# Altium footprint library DIOT_temperature_logger.PcbLib: 100 footprints (part 5 of 7)
Each footprint in its own frame and in the unit in brackets; x right, y up, seen from the top. Pads: shape width x height; smd on the part's side, far side on the other; paste and mask are expansions set on the pad; w line width, h text height; cw(c..) or ccw(c..) is an arc to the next point about the centre after c.
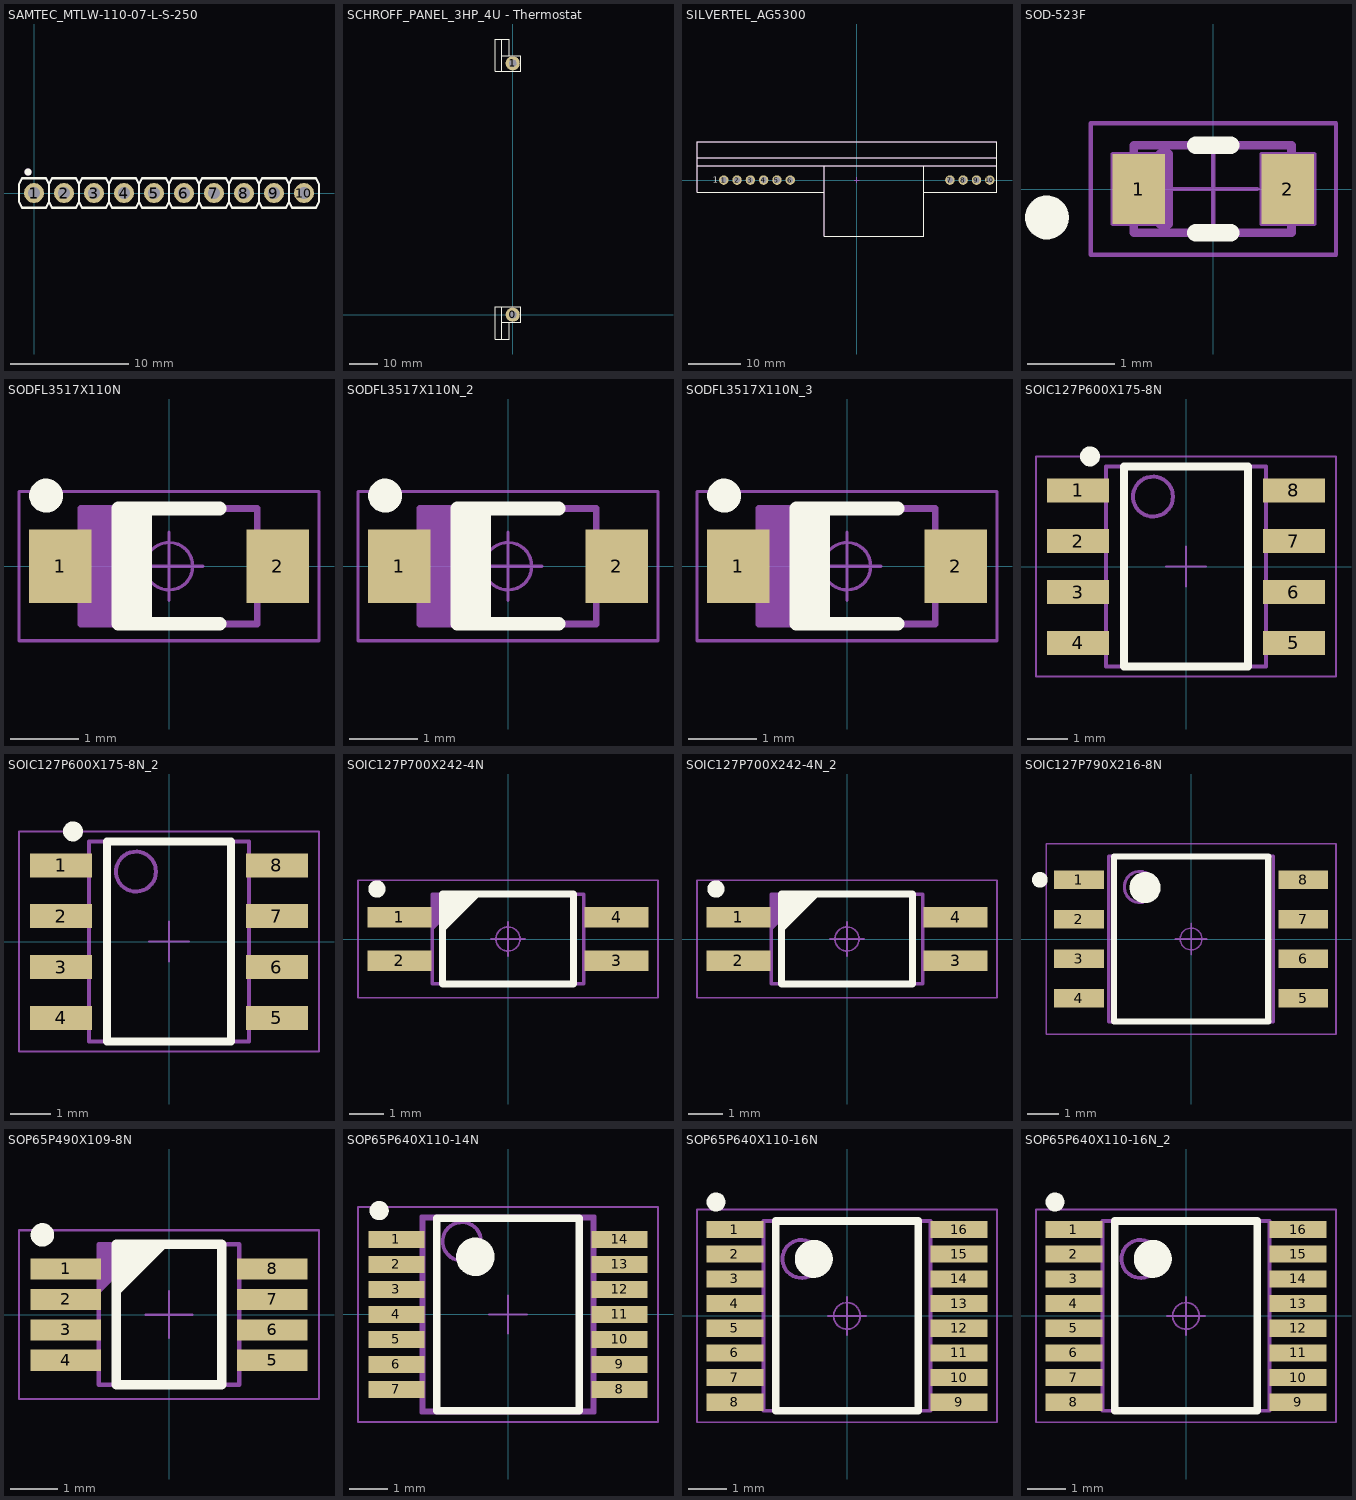
[diagram p4: the footprints below, top view; thin cyan lines are the x and y axes]

## SAMTEC_MTLW-110-07-L-S-250 [mm] "10 Contacts - Pitch 2.54mm - Single Row Through Mount Straight Header (Post Lead = 6.35mm, Tail Lead 3.05mm, Insulator 1.52mm)"
height 7.87
pads (10):
  round 1.7 hole 1: 1(0,0) 2(2.54,0) 3(5.08,0) 4(7.62,0) 5(10.16,0) 6(12.7,0) 7(15.24,0) 8(17.78,0) 9(20.32,0) 10(22.86,0)
Top Overlay:
  circle w0.3: c-0.508,1.778 r0.15
  lines w0.2: 1.27,-0.737 1.27,0.737 ; 1.27,-0.737 1.524,-1.245 3.556,-1.245 3.81,-0.737 ; 1.27,-0.737 1.016,-1.245 -1.016,-1.245 -1.27,-0.737 -1.27,0.737 -1.016,1.245 1.016,1.245 1.27,0.737 ; 1.27,0.737 1.524,1.245 3.556,1.245 3.81,0.737 ; 3.81,-0.737 3.81,0.737 ; 3.81,-0.737 4.064,-1.245 6.096,-1.245 6.35,-0.737 ; 3.81,0.737 4.064,1.245 6.096,1.245 6.35,0.737 ; 6.35,-0.737 6.35,0.737 ; 6.35,-0.737 6.604,-1.245 8.636,-1.245 8.89,-0.737 ; 6.35,0.737 6.604,1.245 8.636,1.245 8.89,0.737 ; 8.89,-0.737 8.89,0.737 ; 8.89,-0.737 9.144,-1.245 11.176,-1.245 11.43,-0.737 ; 8.89,0.737 9.144,1.245 11.176,1.245 11.43,0.737 ; 11.43,-0.737 11.43,0.737 ; 11.43,-0.737 11.684,-1.245 13.716,-1.245 13.97,-0.737 ; 11.43,0.737 11.684,1.245 13.716,1.245 13.97,0.737 ; 13.97,-0.737 13.97,0.737 ; 13.97,-0.737 14.224,-1.245 16.256,-1.245 16.51,-0.737 ; 13.97,0.737 14.224,1.245 16.256,1.245 16.51,0.737 ; 16.51,-0.737 16.51,0.737 ; 16.51,-0.737 16.764,-1.245 18.796,-1.245 19.05,-0.737 ; 16.51,0.737 16.764,1.245 18.796,1.245 19.05,0.737 ; 19.05,-0.737 19.05,0.737 ; 19.05,-0.737 19.304,-1.245 21.336,-1.245 21.59,-0.737 ; 19.05,0.737 19.304,1.245 21.336,1.245 21.59,0.737 ; 21.59,-0.737 21.59,0.737 ; 21.59,-0.737 21.844,-1.245 23.876,-1.245 24.13,-0.737 24.13,0.737 23.876,1.245 21.844,1.245 21.59,0.737
Mechanical 8:
  lines w0.1: -0.5,0 0,0 ; 0,-0.5 0,0 ; 0,0.5 0,0 ; 0.5,0 0,0 ; 2.04,0 2.54,0 ; 2.54,-0.5 2.54,0 ; 2.54,0.5 2.54,0 ; 3.04,0 2.54,0 ; 4.58,0 5.08,0 ; 5.08,-0.5 5.08,0 ; 5.08,0.5 5.08,0 ; 5.58,0 5.08,0 ; 7.12,0 7.62,0 ; 7.62,-0.5 7.62,0 ; 7.62,0.5 7.62,0 ; 8.12,0 7.62,0 ; 9.66,0 10.16,0 ; 10.16,-0.5 10.16,0 ; 10.16,0.5 10.16,0 ; 10.66,0 10.16,0 ; 12.2,0 12.7,0 ; 12.7,-0.5 12.7,0 ; 12.7,0.5 12.7,0 ; 13.2,0 12.7,0 ; 14.74,0 15.24,0 ; 15.24,-0.5 15.24,0 ; 15.24,0.5 15.24,0 ; 15.74,0 15.24,0 ; 17.28,0 17.78,0 ; 17.78,-0.5 17.78,0 ; 17.78,0.5 17.78,0 ; 18.28,0 17.78,0 ; 19.82,0 20.32,0 ; 20.32,-0.5 20.32,0 ; 20.32,0.5 20.32,0 ; 20.82,0 20.32,0 ; 22.36,0 22.86,0 ; 22.86,-0.5 22.86,0 ; 22.86,0.5 22.86,0 ; 23.36,0 22.86,0
Mechanical 14:
  circle w0.3: c-0.508,1.778 r0.15
  lines w0.1: 1.27,-0.737 1.27,0.737 ; 1.27,-0.737 1.016,-1.245 -1.016,-1.245 -1.27,-0.737 -1.27,0.737 -1.016,1.245 1.016,1.245 1.27,0.737 ; 1.27,-0.737 1.524,-1.245 3.556,-1.245 3.81,-0.737 ; 1.27,0.737 1.524,1.245 3.556,1.245 3.81,0.737 ; 3.81,-0.737 3.81,0.737 ; 3.81,-0.737 4.064,-1.245 6.096,-1.245 6.35,-0.737 ; 3.81,0.737 4.064,1.245 6.096,1.245 6.35,0.737 ; 6.35,-0.737 6.35,0.737 ; 6.35,-0.737 6.604,-1.245 8.636,-1.245 8.89,-0.737 ; 6.35,0.737 6.604,1.245 8.636,1.245 8.89,0.737 ; 8.89,-0.737 8.89,0.737 ; 8.89,-0.737 9.144,-1.245 11.176,-1.245 11.43,-0.737 ; 8.89,0.737 9.144,1.245 11.176,1.245 11.43,0.737 ; 11.43,-0.737 11.684,-1.245 13.716,-1.245 13.97,-0.737 ; 11.43,-0.737 11.43,0.737 ; 11.43,0.737 11.684,1.245 13.716,1.245 13.97,0.737 ; 13.97,-0.737 13.97,0.737 ; 13.97,-0.737 14.224,-1.245 16.256,-1.245 16.51,-0.737 ; 13.97,0.737 14.224,1.245 16.256,1.245 16.51,0.737 ; 16.51,-0.737 16.51,0.737 ; 16.51,-0.737 16.764,-1.245 18.796,-1.245 19.05,-0.737 ; 16.51,0.737 16.764,1.245 18.796,1.245 19.05,0.737 ; 19.05,-0.737 19.05,0.737 ; 19.05,-0.737 19.304,-1.245 21.336,-1.245 21.59,-0.737 ; 19.05,0.737 19.304,1.245 21.336,1.245 21.59,0.737 ; 21.59,-0.737 21.59,0.737 ; 21.59,-0.737 21.844,-1.245 23.876,-1.245 24.13,-0.737 24.13,0.737 23.876,1.245 21.844,1.245 21.59,0.737 ; -0.318,-0.318 -0.318,0.318 0.318,0.318 0.318,-0.318 -0.318,-0.318 ; 2.222,-0.318 2.222,0.318 2.857,0.318 2.857,-0.318 2.222,-0.318 ; 4.763,-0.318 4.763,0.318 5.397,0.318 5.397,-0.318 4.763,-0.318 ; 7.302,-0.318 7.302,0.318 7.938,0.318 7.938,-0.318 7.302,-0.318 ; 9.842,-0.318 9.842,0.318 10.477,0.318 10.477,-0.318 9.842,-0.318 ; 12.383,-0.318 12.383,0.318 13.018,0.318 13.018,-0.318 12.383,-0.318 ; 14.922,-0.318 15.557,-0.318 15.557,0.318 14.922,0.318 14.922,-0.318 ; 17.462,-0.318 17.462,0.318 18.098,0.318 18.098,-0.318 17.462,-0.318 ; 20.002,-0.318 20.002,0.318 20.637,0.318 20.637,-0.318 20.002,-0.318 ; 22.543,-0.318 22.543,0.318 23.177,0.318 23.177,-0.318 22.543,-0.318
3D body "SAMTEC_MTLW-110-07-L-S-250.stp": height 7.87, standoff -3.05, extent -1.27,-1.244 24.13,1.245

## SCHROFF_PANEL_3HP_4U - Thermostat [mm] "Schroff PCB 3HP 4U Eurocard Panel Kit"
height 11.9
pads (2):
  round 5 hole 2.7: 0(0,0) 1(0,88.9)
Top Overlay:
  lines w0.254: -4.826,-8.6 -6.1,-8.6 ; -4.826,97.5 -6.1,97.5 ; -3.8,-8.6 -3.8,2.75 2.75,2.75 2.75,-2.75 -3.8,-2.75 ; -3.8,91.65 2.75,91.65 2.75,86.15 -3.8,86.15 -3.8,97.5 ; -3.302,2.75 -6.1,2.75 -6.1,-8.6 ; -3.302,86.15 -6.1,86.15 -6.1,97.5 ; -1.21,-2.75 -1.21,-8.6 -6.1,-8.6 ; -1.21,91.65 -1.21,97.5 -6.1,97.5

## SILVERTEL_AG5300 [mm] "Power-over-Ethernet Plus (POE+) Module, Body L 57.3mm x W 18mm x H 14mm"
height 14
pads (10):
  round 1.8 hole 1.1: 1(-25.406,0) 2(-22.866,0) 3(-20.326,0) 4(-17.786,0) 5(-15.246,0) 6(-12.706,0) 7(17.786,0) 8(20.326,0) 9(22.866,0) 10(25.406,0)
Top Overlay:
  lines w0.2: -30.516,2.7 26.784,2.7 ; -30.516,4.3 26.784,4.3 ; -6.216,-2.3 -30.516,-2.3 -30.516,7.3 26.784,7.3 26.784,-2.3 12.784,-2.3 ; -6.216,2.7 -6.216,-10.7 12.784,-10.7 12.784,2.7
  text "1" at -27.52,-0.55 h1.2
Mechanical 8:
  lines w0.1: -25.906,0 -25.406,0 ; -25.406,-0.5 -25.406,0 ; -25.406,0.5 -25.406,0 ; -24.906,0 -25.406,0 ; -23.366,0 -22.866,0 ; -22.866,-0.5 -22.866,0 ; -22.866,0.5 -22.866,0 ; -22.366,0 -22.866,0 ; -20.826,0 -20.326,0 ; -20.326,-0.5 -20.326,0 ; -20.326,0.5 -20.326,0 ; -19.826,0 -20.326,0 ; -18.286,0 -17.786,0 ; -17.786,-0.5 -17.786,0 ; -17.786,0.5 -17.786,0 ; -17.286,0 -17.786,0 ; -15.746,0 -15.246,0 ; -15.246,-0.5 -15.246,0 ; -15.246,0.5 -15.246,0 ; -14.746,0 -15.246,0 ; -13.206,0 -12.706,0 ; -12.706,-0.5 -12.706,0 ; -12.706,0.5 -12.706,0 ; -12.206,0 -12.706,0 ; -0.5,0 0,0 ; 0,-0.5 0,0 ; 0,0.5 0,0 ; 0.5,0 0,0 ; 17.286,0 17.786,0 ; 17.786,-0.5 17.786,0 ; 17.786,0.5 17.786,0 ; 18.286,0 17.786,0 ; 19.826,0 20.326,0 ; 20.326,-0.5 20.326,0 ; 20.326,0.5 20.326,0 ; 20.826,0 20.326,0 ; 22.366,0 22.866,0 ; 22.866,-0.5 22.866,0 ; 22.866,0.5 22.866,0 ; 23.366,0 22.866,0 ; 24.906,0 25.406,0 ; 25.406,-0.5 25.406,0 ; 25.406,0.5 25.406,0 ; 25.906,0 25.406,0
Mechanical 14:
  lines w0.1: -30.516,2.7 26.784,2.7 ; -30.516,4.3 26.784,4.3 ; -6.216,-2.3 -30.516,-2.3 -30.516,7.3 26.784,7.3 26.784,-2.3 12.784,-2.3 ; -6.216,2.7 -6.216,-10.7 12.784,-10.7 12.784,2.7
  text "1" at -27.52,-0.55 h1.2
3D body "SILVERTEL_AG5300.stp": height 14, standoff -3, extent -30.516,-10.7 26.784,7.3

## SOD-523F [mm] "Small Outline Diode Flat Lead (SOD-523F), Body; 1.80mm L X 1mm W X 0.85mm H"
height 0.85
pads (2):
  rect 0.6x0.8 smd: 1(-0.85,0) 2(0.85,0)
Top Overlay:
  circle w0.25: c-1.9,-0.325 r0.125
  lines w0.2: -0.2,-0.5 0.2,-0.5 ; -0.2,0.5 0.2,0.5
Mechanical 8:
  lines w0.05: -0.5,0 0,0 ; 0,-0.5 0,0 ; 0,0.5 0,0 ; 0.5,0 0,0 ; -1.15,-0.4 -0.85,0 -1.15,0.4 ; -1.15,-0.4 -0.55,-0.4 -0.55,0.4 -1.15,0.4 ; -1.15,-0.4 -1.15,0.4 ; 1.15,-0.4 0.85,0 1.15,0.4 ; 1.15,-0.4 0.55,-0.4 0.55,0.4 1.15,0.4 ; 1.15,-0.4 1.15,0.4
Mechanical 14:
  lines w0.1: -0.609,-0.4 -0.609,0.4 ; -0.609,-0.4 -0.509,-0.4 ; -0.609,-0.4 -0.609,0.4 ; -0.609,-0.4 -0.509,-0.4 ; -0.609,0.4 -0.509,0.4 ; -0.609,0.4 -0.509,0.4 ; -0.509,-0.4 -0.509,0.4 ; -0.509,-0.4 -0.509,0.4 ; -0.909,-0.5 -0.909,0.5 0.891,0.5 0.891,-0.5 -0.909,-0.5
Mechanical 15:
  lines w0.05: -1.4,-0.75 1.4,-0.75 1.4,0.75 -1.4,0.75 -1.4,-0.75
3D body "SOD-523F.stp": height 0.85, standoff 0, extent -0.909,-0.5 0.891,0.5

## SODFL3517X110N [mm] "SODFL Diode (SOD123W); 2.60mm W X 1.70mm L X 1.10mm H body, IPC Medium Density"
height 1.1
pads (2):
  rect 0.92x1.08 smd: 1(-1.6,0) 2(1.6,0)
Top Overlay:
  circle w0.25: c-1.81,1.04 r0.125
  lines w0.2: -0.55,-0.85 -0.55,0.85 ; -0.35,-0.85 -0.35,0.85 ; 0.75,-0.85 -0.75,-0.85 -0.75,0.85 0.75,0.85
Mechanical 14:
  lines w0.1: -1.2,-0.85 -1.2,0.85 ; -1.1,-0.85 -1.1,0.85 ; -1,-0.85 -1,0.85 ; -0.9,-0.85 -0.9,0.85 ; -0.8,-0.85 -0.8,0.85 ; -0.7,-0.85 -0.7,0.85 ; -0.6,-0.85 -0.6,0.85 ; -0.5,-0.85 -0.5,0.85 ; -1.3,-0.85 -1.3,0.85 1.3,0.85 1.3,-0.85 -1.3,-0.85
Mechanical 15:
  circle w0.05: c0,0 r0.35
  lines w0.05: -0.5,0 0.5,0 ; 0,-0.5 0,0.5 ; -2.21,-1.1 -2.21,1.1 2.21,1.1 2.21,-1.1 -2.21,-1.1
3D body "SODFL3517X110N.stp": height 1.1, standoff 0, extent -1.85,-0.95 1.85,0.95

## SODFL3517X110N_2 [mm]
pads (2):
  rect 0.92x1.08 smd: 1(-1.6,0) 2(1.6,0)
Top Overlay:
  circle w0.25: c-1.81,1.04 r0.125
  lines w0.2: -0.55,-0.85 -0.55,0.85 ; -0.35,-0.85 -0.35,0.85 ; 0.75,-0.85 -0.75,-0.85 -0.75,0.85 0.75,0.85
Mechanical 14:
  lines w0.1: -1.2,-0.85 -1.2,0.85 ; -1.1,-0.85 -1.1,0.85 ; -1,-0.85 -1,0.85 ; -0.9,-0.85 -0.9,0.85 ; -0.8,-0.85 -0.8,0.85 ; -0.7,-0.85 -0.7,0.85 ; -0.6,-0.85 -0.6,0.85 ; -0.5,-0.85 -0.5,0.85 ; -1.3,-0.85 -1.3,0.85 1.3,0.85 1.3,-0.85 -1.3,-0.85
Mechanical 15:
  circle w0.05: c0,0 r0.35
  lines w0.05: -0.5,0 0.5,0 ; 0,-0.5 0,0.5 ; -2.21,-1.1 -2.21,1.1 2.21,1.1 2.21,-1.1 -2.21,-1.1
3D body "SODFL3517X110N.stp": height 1.1, standoff 0, extent -1.85,-0.95 1.85,0.95

## SODFL3517X110N_3 [mm]
pads (2):
  rect 0.92x1.08 smd: 1(-1.6,0) 2(1.6,0)
Top Overlay:
  circle w0.25: c-1.81,1.04 r0.125
  lines w0.2: -0.55,-0.85 -0.55,0.85 ; -0.35,-0.85 -0.35,0.85 ; 0.75,-0.85 -0.75,-0.85 -0.75,0.85 0.75,0.85
Mechanical 14:
  lines w0.1: -1.2,-0.85 -1.2,0.85 ; -1.1,-0.85 -1.1,0.85 ; -1,-0.85 -1,0.85 ; -0.9,-0.85 -0.9,0.85 ; -0.8,-0.85 -0.8,0.85 ; -0.7,-0.85 -0.7,0.85 ; -0.6,-0.85 -0.6,0.85 ; -0.5,-0.85 -0.5,0.85 ; -1.3,-0.85 -1.3,0.85 1.3,0.85 1.3,-0.85 -1.3,-0.85
Mechanical 15:
  circle w0.05: c0,0 r0.35
  lines w0.05: -0.5,0 0.5,0 ; 0,-0.5 0,0.5 ; -2.21,-1.1 -2.21,1.1 2.21,1.1 2.21,-1.1 -2.21,-1.1
3D body "SODFL3517X110N.stp": height 1.1, standoff 0, extent -1.85,-0.95 1.85,0.95

## SOIC127P600X175-8N [mm] "SOIC 8, Pitch 1.27mm - Body 4x5mm, IPC Medium Density"
height 1.75
pads (8):
  rect 1.55x0.6 smd: 1(-2.7,1.905) 2(-2.7,0.635) 3(-2.7,-0.635) 4(-2.7,-1.905) 5(2.7,-1.905) 6(2.7,-0.635) 7(2.7,0.635) 8(2.7,1.905)
Top Overlay:
  circle w0.25: c-2.4,2.755 r0.125
  lines w0.2: -1.55,-2.5 1.55,-2.5 1.55,2.5 -1.55,2.5 -1.55,-2.5
Mechanical 14:
  circle w0.1: c-0.825,1.75 r0.5
  lines w0.1: -2,-2.5 2,-2.5 2,2.5 -2,2.5 -2,-2.5
Mechanical 15:
  lines w0.05: -0.5,0 0.5,0 ; 0,-0.5 0,0.5 ; -3.75,-2.75 3.75,-2.75 3.75,2.75 -3.75,2.75 -3.75,-2.75
3D body "SOIC127P600X175-8N.stp": height 1.75, standoff 0, extent -3.1,-2.5 3.1,2.5

## SOIC127P600X175-8N_2 [mm]
pads (8):
  rect 1.55x0.6 smd: 1(-2.7,1.905) 2(-2.7,0.635) 3(-2.7,-0.635) 4(-2.7,-1.905) 5(2.7,-1.905) 6(2.7,-0.635) 7(2.7,0.635) 8(2.7,1.905)
Top Overlay:
  circle w0.25: c-2.4,2.755 r0.125
  lines w0.2: -1.55,-2.5 1.55,-2.5 1.55,2.5 -1.55,2.5 -1.55,-2.5
Mechanical 14:
  circle w0.1: c-0.825,1.75 r0.5
  lines w0.1: -2,-2.5 -2,2.5 2,2.5 2,-2.5 -2,-2.5
Mechanical 15:
  lines w0.05: -0.5,0 0.5,0 ; 0,-0.5 0,0.5 ; -3.75,-2.75 -3.75,2.75 3.75,2.75 3.75,-2.75 -3.75,-2.75
3D body "SOIC127P600X175-8N.stp": height 1.75, standoff 0, extent -3.1,-2.5 3.1,2.5

## SOIC127P700X242-4N [mm] "SOIC, 1.27mm, pitch; 4 pin, 2.60mm W X 4.40mm L X 2.42mm H body, IPC Medium Density"
height 2.42
pads (4):
  rect 1.85x0.6 smd: 1(-3.15,0.635) 2(-3.15,-0.635) 3(3.15,-0.635) 4(3.15,0.635)
Top Overlay:
  circle w0.25: c-3.8,1.45 r0.125
  lines w0.2: -1.9,0.3 -0.9,1.3 ; -1.9,0.5 -1.1,1.3 ; -1.9,0.7 -1.3,1.3 ; -1.9,0.9 -1.5,1.3 ; -1.9,1.1 -1.7,1.3 ; -1.9,-1.3 -1.9,1.3 1.9,1.3 1.9,-1.3 -1.9,-1.3
Mechanical 14:
  lines w0.1: -2.2,0.3 -1.2,1.3 ; -2.2,0.4 -1.3,1.3 ; -2.2,0.5 -1.4,1.3 ; -2.2,0.6 -1.5,1.3 ; -2.2,0.7 -1.6,1.3 ; -2.2,0.8 -1.7,1.3 ; -2.2,0.9 -1.8,1.3 ; -2.2,1 -1.9,1.3 ; -2.2,1.1 -2,1.3 ; -2.2,1.2 -2.1,1.3 ; -2.2,-1.3 -2.2,1.3 2.2,1.3 2.2,-1.3 -2.2,-1.3
Mechanical 15:
  circle w0.05: c0,0 r0.35
  lines w0.05: -0.5,0 0.5,0 ; 0,-0.5 0,0.5 ; -4.35,-1.7 -4.35,1.7 4.35,1.7 4.35,-1.7 -4.35,-1.7
3D body "SOIC127P700X242-4N.stp": height 2.32, standoff 0, extent -3.5,-1.3 3.5,1.3

## SOIC127P700X242-4N_2 [mm]
pads (4):
  rect 1.85x0.6 smd: 1(-3.15,0.635) 2(-3.15,-0.635) 3(3.15,-0.635) 4(3.15,0.635)
Top Overlay:
  circle w0.25: c-3.8,1.45 r0.125
  lines w0.2: -1.9,0.3 -0.9,1.3 ; -1.9,0.5 -1.1,1.3 ; -1.9,0.7 -1.3,1.3 ; -1.9,0.9 -1.5,1.3 ; -1.9,1.1 -1.7,1.3 ; -1.9,-1.3 -1.9,1.3 1.9,1.3 1.9,-1.3 -1.9,-1.3
Mechanical 14:
  lines w0.1: -2.2,0.3 -1.2,1.3 ; -2.2,0.4 -1.3,1.3 ; -2.2,0.5 -1.4,1.3 ; -2.2,0.6 -1.5,1.3 ; -2.2,0.7 -1.6,1.3 ; -2.2,0.8 -1.7,1.3 ; -2.2,0.9 -1.8,1.3 ; -2.2,1 -1.9,1.3 ; -2.2,1.1 -2,1.3 ; -2.2,1.2 -2.1,1.3 ; -2.2,-1.3 -2.2,1.3 2.2,1.3 2.2,-1.3 -2.2,-1.3
Mechanical 15:
  circle w0.05: c0,0 r0.35
  lines w0.05: -0.5,0 0.5,0 ; 0,-0.5 0,0.5 ; -4.35,-1.7 -4.35,1.7 4.35,1.7 4.35,-1.7 -4.35,-1.7
3D body "SOIC127P700X242-4N.stp": height 2.32, standoff 0, extent -3.5,-1.3 3.5,1.3

## SOIC127P790X216-8N [mm] "SOIC, 1.27mm, Pitch; 8 Pin, 5.285mm W X 5.335mm L X 2.16mm H body, IPC Medium Density"
height 2.16
pads (8):
  rect 1.6x0.6 smd: 1(-3.6,1.905) 2(-3.6,0.635) 3(-3.6,-0.635) 4(-3.6,-1.905) 5(3.6,-1.905) 6(3.6,-0.635) 7(3.6,0.635) 8(3.6,1.905)
Top Overlay:
  circle w0.5: c-1.475,1.65 r0.25
  circle w0.25: c-4.85,1.9 r0.125
  lines w0.2: -2.475,-2.65 -2.475,2.65 2.475,2.65 2.475,-2.65 -2.475,-2.65
Mechanical 14:
  circle w0.1: c-1.642,1.668 r0.5
  lines w0.1: -2.642,-2.668 2.642,-2.668 2.642,2.668 -2.642,2.668 -2.642,-2.668
Mechanical 15:
  circle w0.05: c0,0 r0.35
  lines w0.05: -0.5,0 0.5,0 ; 0,-0.5 0,0.5 ; -4.65,-3.05 4.65,-3.05 4.65,3.05 -4.65,3.05 -4.65,-3.05
3D body "SOIC127P790X216-8N.stp": height 2, standoff 0, extent -3.863,-2.54 3.863,2.54

## SOP65P490X109-8N [mm] "SOP, 0.65mm pitch; 8 pin,3.00mm W X 3.00mm L X 1.09mm H bodyI, PC Medium Density"
height 1.09
pads (8):
  rect 1.5x0.45 smd: 1(-2.2,0.975) 2(-2.2,0.325) 3(-2.2,-0.325) 4(-2.2,-0.975) 5(2.2,-0.975) 6(2.2,-0.325) 7(2.2,0.325) 8(2.2,0.975)
Top Overlay:
  circle w0.25: c-2.7,1.7 r0.125
  lines w0.2: -1.125,0.5 -0.125,1.5 ; -1.125,0.7 -0.325,1.5 ; -1.125,0.9 -0.525,1.5 ; -1.125,1.1 -0.725,1.5 ; -1.125,1.3 -0.925,1.5 ; -1.125,-1.5 1.125,-1.5 1.125,1.5 -1.125,1.5 -1.125,-1.5
Mechanical 14:
  lines w0.1: -1.5,0.5 -0.5,1.5 ; -1.5,0.6 -0.6,1.5 ; -1.5,0.7 -0.7,1.5 ; -1.5,0.8 -0.8,1.5 ; -1.5,0.9 -0.9,1.5 ; -1.5,1 -1,1.5 ; -1.5,1.1 -1.1,1.5 ; -1.5,1.2 -1.2,1.5 ; -1.5,1.3 -1.3,1.5 ; -1.5,1.4 -1.4,1.5 ; -1.5,-1.5 1.5,-1.5 1.5,1.5 -1.5,1.5 -1.5,-1.5
Mechanical 15:
  lines w0.05: -0.5,0 0.5,0 ; 0,-0.5 0,0.5 ; -3.2,-1.8 3.2,-1.8 3.2,1.8 -3.2,1.8 -3.2,-1.8
3D body "SOP65P490X109-8N.stp": height 1.09, standoff 0, extent -2.45,-1.55 2.45,1.55

## SOP65P640X110-14N [mm] "SOP, 14-Leads, Body 4.4x5mm (max), Pitch 0.65mm, IPC Medium Density"
height 1.1
pads (14):
  rect 1.45x0.45 smd: 1(-2.9,1.95) 2(-2.9,1.3) 3(-2.9,0.65) 4(-2.9,0) 5(-2.9,-0.65) 6(-2.9,-1.3) 7(-2.9,-1.95) 8(2.9,-1.95) 9(2.9,-1.3) 10(2.9,-0.65) 11(2.9,0) 12(2.9,0.65) 13(2.9,1.3) 14(2.9,1.95)
Top Overlay:
  circle w0.5: c-0.85,1.5 r0.25
  circle w0.25: c-3.35,2.7 r0.125
  lines w0.2: -1.85,-2.5 -1.85,2.5 1.85,2.5 1.85,-2.5 -1.85,-2.5
Mechanical 14:
  circle w0.1: c-1.2,1.9 r0.5
  lines w0.1: -2.25,-2.55 2.25,-2.55 2.25,2.55 -2.25,2.55 -2.25,-2.55 ; -2.2,-2.5 2.2,-2.5 2.2,2.5 -2.2,2.5 -2.2,-2.5
Mechanical 15:
  lines w0.05: -0.5,0 0.5,0 ; 0,-0.5 0,0.5 ; -3.9,-2.8 3.9,-2.8 3.9,2.8 -3.9,2.8 -3.9,-2.8
3D body "SOP65P640X110-14N.stp": height 1.1, standoff 0, extent -3.121,-2.55 3.121,2.55

## SOP65P640X110-16N [mm] "SOP, 0.65mm pitch; 16 pin, 4.40mm W X 5.00mm L X 1.10mm H body IPC Medium Density"
height 1.1
pads (16):
  rect 1.5x0.45 smd: 1(-2.95,2.275) 2(-2.95,1.625) 3(-2.95,0.975) 4(-2.95,0.325) 5(-2.95,-0.325) 6(-2.95,-0.975) 7(-2.95,-1.625) 8(-2.95,-2.275) 9(2.95,-2.275) 10(2.95,-1.625) 11(2.95,-0.975) 12(2.95,-0.325) 13(2.95,0.325) 14(2.95,0.975) 15(2.95,1.625) 16(2.95,2.275)
Top Overlay:
  circle w0.25: c-3.45,3 r0.125
  circle w0.5: c-0.875,1.5 r0.25
  lines w0.2: -1.875,-2.5 -1.875,2.5 1.875,2.5 1.875,-2.5 -1.875,-2.5
Mechanical 14:
  circle w0.1: c-1.2,1.5 r0.5
  lines w0.1: -2.2,-2.5 -2.2,2.5 2.2,2.5 2.2,-2.5 -2.2,-2.5
Mechanical 15:
  circle w0.05: c0,0 r0.35
  lines w0.05: -0.5,0 0.5,0 ; 0,-0.5 0,0.5 ; -3.95,-2.8 -3.95,2.8 3.95,2.8 3.95,-2.8 -3.95,-2.8
3D body "SOP65P640X110-16N.stp": height 1.1, standoff 0, extent -3.121,-2.55 3.121,2.55

## SOP65P640X110-16N_2 [mm]
pads (16):
  rect 1.5x0.45 smd: 1(-2.95,2.275) 2(-2.95,1.625) 3(-2.95,0.975) 4(-2.95,0.325) 5(-2.95,-0.325) 6(-2.95,-0.975) 7(-2.95,-1.625) 8(-2.95,-2.275) 9(2.95,-2.275) 10(2.95,-1.625) 11(2.95,-0.975) 12(2.95,-0.325) 13(2.95,0.325) 14(2.95,0.975) 15(2.95,1.625) 16(2.95,2.275)
Top Overlay:
  circle w0.5: c-0.875,1.5 r0.25
  circle w0.25: c-3.45,3 r0.125
  lines w0.2: -1.875,-2.5 1.875,-2.5 1.875,2.5 -1.875,2.5 -1.875,-2.5
Mechanical 14:
  circle w0.1: c-1.2,1.5 r0.5
  lines w0.1: -2.2,-2.5 2.2,-2.5 2.2,2.5 -2.2,2.5 -2.2,-2.5
Mechanical 15:
  circle w0.05: c0,0 r0.35
  lines w0.05: -0.5,0 0.5,0 ; 0,-0.5 0,0.5 ; -3.95,-2.8 3.95,-2.8 3.95,2.8 -3.95,2.8 -3.95,-2.8
3D body "SOP65P640X110-16N.stp": height 1.1, standoff 0, extent -3.121,-2.55 3.121,2.55